# Altium footprint library SOURIAU THD.PcbLib: 34 footprints (part 3 of 5) (continued)
## SOURIAU_EDA-02872-V1-1 [mm] "SOURIAU UTG0187PVDEX Connector VDE 7 Male Contacts Mounted On 20mm M3 Spacer" (continued)
  text "VDE7M" at -3.5,14.8 h1.5
  text "7" at -0.667,-1 h2
  text "6" at -6.768,2.55 h2
  text "5" at -6.815,-4.55 h2
  text "4" at -0.714,-8.1 h2
  text "3" at 5.482,-4.55 h2
  text "2" at 5.482,2.55 h2
  text "1" at -0.238,6.1 h2
  text "7" at -0.667,-1 h2
3D body "SOURIAU_EDA-02872-V1-1.stp": height 35.6, standoff -12.9, extent -16.775,-16.775 16.775,16.775

## SOURIAU_EDA-03025-V1-0 [mm] "SOURIAU UTO0128P21T Adapter Kit For PCB Mount, 8 Poles, Shell Size 12, UT Bantam Circular Male Connector"
height 31.7
pads (12):
  round 1.9 hole 1.2: 1(0,0) 2(4.45,0.9) 3(3.45,-2.85) 4(0,-4.5) 5(-3.45,-2.85) 6(-4.45,0.9) 7(-2,4) 8(2,4)
  round 6.2 hole 3.2: MECH1(-10.31,10.31) MECH2(10.31,10.31) MECH3(-10.31,-10.31) MECH4(10.31,-10.31)
Top Overlay:
  circle w0.2: c0,0 r9.48
  circle w0.2: c2,4 r1.6
  circle w0.2: c2,4 r1.35
  circle w0.2: c-2,4 r1.35
  circle w0.2: c-4.45,0.9 r1.35
  circle w0.2: c0,-4.5 r1.35
  circle w0.2: c3.45,-2.85 r1.35
  circle w0.2: c4.45,0.9 r1.35
  circle w0.2: c-3.45,-2.85 r1.6
  circle w0.2: c-3.45,-2.85 r1.35
  circle w0.2: c0,0 r1.6
  circle w0.2: c0,0 r1.35
  lines w0.2: -13.09,-8.184 -13.09,8.184 ; -8.642,3.898 -9.798,4.566 cw(c0,0) -8.383,6.826 -6.579,6.826 ; -8.184,-13.09 8.184,-13.09 ; -8.184,13.09 8.184,13.09 ; -4.102,-0.404 -3.862,-1.304 ; -3.613,1.959 -2.837,2.941 ; -3.277,-5.758 cw(c0,0) 4.659,4.71 ; -2.622,-9.11 -1.72,-10.672 ccw(c0,0) 0.945,-10.769 0.945,-9.433 ; -2.007,-3.54 -1.218,-3.918 ; -1.726,-6.396 ccw(c0,0) 5.71,3.359 ; -0.65,4 0.4,4 ; 1.218,-3.918 2.232,-3.432 ; 1.568,0.317 3.127,0.632 ; 3.798,-1.546 4.102,-0.404 ; 7.697,5.535 8.853,6.203 cw(c0,0) 10.102,3.847 9.201,2.285 ; 13.09,-8.184 13.09,8.184 ; -8.632,-1.433 ccw(c0,0) -8.192,-3.075 -7.24,-2.82 ccw(c0,0) -5.616,-5.37 -6.249,-6.125 ccw(c0,0) -4.947,-7.218 -4.313,-6.463 ccw(c0,0) 3.734,-6.814 4.299,-7.621 ccw(c0,0) 5.691,-6.646 5.126,-5.839 ccw(c0,0) 7.62,-1.52 8.601,-1.606 ccw(c0,0) 8.75,0.088 7.768,0.174 ccw(c0,0) 1.65,7.593 1.65,8.593 ccw(c0,0) -1.65,8.593 -1.65,7.593 ccw(c0,0) -7.68,-1.178 -8.632,-1.433
  text "8" at 4.25,2.745 h1.2
  text "5" at -2.643,-5.887 h1.2
  text "1" at -2.437,0.898 h1.2
Mechanical 8:
  lines w0.1: -10.81,-10.31 -10.31,-10.31 ; -10.81,10.31 -10.31,10.31 ; -10.31,-10.81 -10.31,-10.31 ; -10.31,-9.81 -10.31,-10.31 ; -10.31,9.81 -10.31,10.31 ; -10.31,10.81 -10.31,10.31 ; -9.81,-10.31 -10.31,-10.31 ; -9.81,10.31 -10.31,10.31 ; -4.95,0.9 -4.45,0.9 ; -4.45,0.4 -4.45,0.9 ; -4.45,1.4 -4.45,0.9 ; -3.95,-2.85 -3.45,-2.85 ; -3.95,0.9 -4.45,0.9 ; -3.45,-3.35 -3.45,-2.85 ; -3.45,-2.35 -3.45,-2.85 ; -2.95,-2.85 -3.45,-2.85 ; -2.5,4 -2,4 ; -2,3.5 -2,4 ; -2,4.5 -2,4 ; -1.5,4 -2,4 ; -0.5,-4.5 0,-4.5 ; -0.354,-0.354 0,0 ; -0.354,0.354 0,0 ; 0,-5 0,-4.5 ; 0,-4 0,-4.5 ; 0.354,-0.354 0,0 ; 0.354,0.354 0,0 ; 0.5,-4.5 0,-4.5 ; 1.5,4 2,4 ; 2,3.5 2,4 ; 2,4.5 2,4 ; 2.5,4 2,4 ; 2.95,-2.85 3.45,-2.85 ; 3.45,-3.35 3.45,-2.85 ; 3.45,-2.35 3.45,-2.85 ; 3.95,-2.85 3.45,-2.85 ; 3.95,0.9 4.45,0.9 ; 4.45,0.4 4.45,0.9 ; 4.45,1.4 4.45,0.9 ; 4.95,0.9 4.45,0.9 ; 9.81,-10.31 10.31,-10.31 ; 9.81,10.31 10.31,10.31 ; 10.31,-10.81 10.31,-10.31 ; 10.31,-9.81 10.31,-10.31 ; 10.31,9.81 10.31,10.31 ; 10.31,10.81 10.31,10.31 ; 10.81,-10.31 10.31,-10.31 ; 10.81,10.31 10.31,10.31
Mechanical 14:
  circle w0.1: c0,0 r9.48
  circle w0.1: c0,0 r6.625
  circle w0.1: c-10.31,-10.31 r1.45
  circle w0.1: c-10.31,-10.31 r2.8
  circle w0.1: c10.31,-10.31 r1.45
  circle w0.1: c10.31,-10.31 r2.8
  circle w0.1: c10.31,10.31 r1.45
  circle w0.1: c10.31,10.31 r2.8
  circle w0.1: c-10.31,10.31 r1.45
  circle w0.1: c-10.31,10.31 r2.8
  circle w0.1: c2,4 r1.6
  circle w0.1: c2,4 r1.35
  circle w0.1: c-2,4 r1.35
  circle w0.1: c-4.45,0.9 r1.35
  circle w0.1: c0,-4.5 r1.35
  circle w0.1: c3.45,-2.85 r1.35
  circle w0.1: c4.45,0.9 r1.35
  circle w0.1: c-3.45,-2.85 r1.6
  circle w0.1: c-3.45,-2.85 r1.35
  circle w0.1: c0,0 r1.6
  circle w0.1: c0,0 r1.35
  lines w0.1: -8.642,3.898 -9.798,4.566 cw(c0,0) -8.383,6.826 -6.579,6.826 ; -4.102,-0.404 -3.862,-1.304 ; -3.613,1.959 -2.837,2.941 ; -2.622,-9.11 -1.72,-10.672 ccw(c0,0) 0.945,-10.769 0.945,-9.433 ; -2.007,-3.54 -1.218,-3.918 ; -0.65,4 0.4,4 ; 1.218,-3.918 2.232,-3.432 ; 1.568,0.317 3.127,0.632 ; 3.798,-1.546 4.102,-0.404 ; 7.697,5.535 8.853,6.203 cw(c0,0) 10.102,3.847 9.201,2.285 ; -13.09,-11.615 -13.09,11.615 -11.615,13.09 11.615,13.09 13.09,11.615 13.09,-11.615 11.615,-13.09 -11.615,-13.09 -13.09,-11.615 ; -11.472,-10.666 ccw(c-11.28,-10.87) -11.2,-11.138 cw(c-11.059,-11.608) -10.582,-11.495 ccw(c-10.31,-11.43) -10.038,-11.495 cw(c-9.561,-11.608) -9.42,-11.138 ccw(c-9.34,-10.87) -9.148,-10.666 cw(c-8.812,-10.31) -9.148,-9.954 ccw(c-9.34,-9.75) -9.42,-9.482 cw(c-9.561,-9.012) -10.038,-9.125 ccw(c-10.31,-9.19) -10.582,-9.125 cw(c-11.059,-9.012) -11.2,-9.482 ccw(c-11.28,-9.75) -11.472,-9.954 cw(c-11.808,-10.31) -11.472,-10.666 ; -11.472,9.954 ccw(c-11.28,9.75) -11.2,9.482 cw(c-11.059,9.012) -10.582,9.125 ccw(c-10.31,9.19) -10.038,9.125 cw(c-9.561,9.012) -9.42,9.482 ccw(c-9.34,9.75) -9.148,9.954 cw(c-8.812,10.31) -9.148,10.666 ccw(c-9.34,10.87) -9.42,11.138 cw(c-9.561,11.608) -10.038,11.495 ccw(c-10.31,11.43) -10.582,11.495 cw(c-11.059,11.608) -11.2,11.138 ccw(c-11.28,10.87) -11.472,10.666 cw(c-11.808,10.31) -11.472,9.954 ; -8.632,-1.433 ccw(c0,0) -8.192,-3.075 -7.24,-2.82 ccw(c0,0) -5.616,-5.37 -6.249,-6.125 ccw(c0,0) -4.947,-7.218 -4.313,-6.463 ccw(c0,0) 3.734,-6.814 4.299,-7.621 ccw(c0,0) 5.691,-6.646 5.126,-5.839 ccw(c0,0) 7.62,-1.52 8.601,-1.606 ccw(c0,0) 8.75,0.088 7.768,0.174 ccw(c0,0) 1.65,7.593 1.65,8.593 ccw(c0,0) -1.65,8.593 -1.65,7.593 ccw(c0,0) -7.68,-1.178 -8.632,-1.433 ; 9.148,-10.666 ccw(c9.34,-10.87) 9.42,-11.138 cw(c9.561,-11.608) 10.038,-11.495 ccw(c10.31,-11.43) 10.582,-11.495 cw(c11.059,-11.608) 11.2,-11.138 ccw(c11.28,-10.87) 11.472,-10.666 cw(c11.808,-10.31) 11.472,-9.954 ccw(c11.28,-9.75) 11.2,-9.482 cw(c11.059,-9.012) 10.582,-9.125 ccw(c10.31,-9.19) 10.038,-9.125 cw(c9.561,-9.012) 9.42,-9.482 ccw(c9.34,-9.75) 9.148,-9.954 cw(c8.812,-10.31) 9.148,-10.666 ; 9.148,9.954 ccw(c9.34,9.75) 9.42,9.482 cw(c9.561,9.012) 10.038,9.125 ccw(c10.31,9.19) 10.582,9.125 cw(c11.059,9.012) 11.2,9.482 ccw(c11.28,9.75) 11.472,9.954 cw(c11.808,10.31) 11.472,10.666 ccw(c11.28,10.87) 11.2,11.138 cw(c11.059,11.608) 10.582,11.495 ccw(c10.31,11.43) 10.038,11.495 cw(c9.561,11.608) 9.42,11.138 ccw(c9.34,10.87) 9.148,10.666 cw(c8.812,10.31) 9.148,9.954
  text "8" at 4.25,2.745 h1.2
  text "7" at -2.4,3.4 h1.2
  text "6" at -4.821,0.3 h1.2
  text "4" at -0.429,-5.1 h1.2
  text "3" at 3.05,-3.45 h1.2
  text "2" at 4.05,0.3 h1.2
  text "5" at -2.643,-5.887 h1.2
  text "1" at -2.437,0.898 h1.2
3D body "SOURIAU_EDA-03025-V1-0.stp": height 32.93, standoff -14.87, extent -13.41,-13.403 13.41,13.404

## SOURIAU_EDA-03026-V1-0 [mm] "SOURIAU UTO0128S21T Adapter Kit For PCB Mount, 8 Poles, Shell Size 12, UT Bantam Circular Female Connector"
height 24.3
pads (12):
  round 1.9 hole 1.2: 1(0,0) 2(-4.45,0.9) 3(-3.45,-2.85) 4(0,-4.5) 5(3.45,-2.85) 6(4.45,0.9) 7(2,4) 8(-2,4)
  round 6.2 hole 3.2: MECH1(-10.31,10.31) MECH2(10.31,10.31) MECH3(-10.31,-10.31) MECH4(10.31,-10.31)
Top Overlay:
  circle w0.2: c0,0 r1.35
  circle w0.2: c0,0 r1.6
  circle w0.2: c-3.45,-2.85 r1.35
  circle w0.2: c4.45,0.9 r1.35
  circle w0.2: c3.45,-2.85 r1.35
  circle w0.2: c0,-4.5 r1.35
  circle w0.2: c-4.45,0.9 r1.35
  circle w0.2: c-2,4 r1.35
  circle w0.2: c2,4 r1.35
  circle w0.2: c0,0 r9.48
  circle w0.2: c-2,4 r1.6
  circle w0.2: c3.45,-2.85 r1.6
  lines w0.2: -13.09,-8.184 -13.09,8.184 ; -8.641,3.898 -9.798,4.566 cw(c0,0) -8.383,6.826 -6.579,6.826 ; -8.184,-13.09 8.184,-13.09 ; -8.184,13.09 8.184,13.09 ; -5.495,3.665 ccw(c0,-0.035) 1.886,-6.386 ; -4.704,4.629 cw(c0,-0.035) 3.275,-5.794 ; -4.102,-0.404 -3.798,-1.546 ; -3.127,0.632 -1.568,0.317 ; -2.622,-9.11 -1.72,-10.672 ccw(c0,0) 0.945,-10.769 0.945,-9.433 ; -2.232,-3.432 -1.218,-3.918 ; -0.4,4 0.65,4 ; 1.218,-3.918 2.007,-3.54 ; 2.837,2.941 3.613,1.959 ; 3.862,-1.304 4.102,-0.404 ; 7.697,5.535 8.853,6.203 cw(c0,0) 10.102,3.847 9.201,2.285 ; 13.09,-8.184 13.09,8.184 ; -8.632,-1.433 ccw(c0,0) -8.192,-3.075 -7.24,-2.82 ccw(c0,0) -5.616,-5.37 -6.249,-6.125 ccw(c0,0) -4.947,-7.218 -4.313,-6.463 ccw(c0,0) 3.734,-6.814 4.299,-7.621 ccw(c0,0) 5.691,-6.646 5.126,-5.839 ccw(c0,0) 7.62,-1.52 8.601,-1.606 ccw(c0,0) 8.75,0.088 7.768,0.174 ccw(c0,0) 1.65,7.593 1.65,8.593 ccw(c0,0) -1.65,8.593 -1.65,7.593 ccw(c0,0) -7.68,-1.178 -8.632,-1.433
  text "1" at -2.599,-1.227 h1.2
  text "5" at 2.021,-5.887 h1.2
  text "8" at -4.859,2.745 h1.2
Mechanical 8:
  lines w0.1: -10.81,-10.31 -10.31,-10.31 ; -10.81,10.31 -10.31,10.31 ; -10.31,-10.81 -10.31,-10.31 ; -10.31,-9.81 -10.31,-10.31 ; -10.31,9.81 -10.31,10.31 ; -10.31,10.81 -10.31,10.31 ; -9.81,-10.31 -10.31,-10.31 ; -9.81,10.31 -10.31,10.31 ; -4.95,0.9 -4.45,0.9 ; -4.45,0.4 -4.45,0.9 ; -4.45,1.4 -4.45,0.9 ; -3.95,-2.85 -3.45,-2.85 ; -3.95,0.9 -4.45,0.9 ; -3.45,-3.35 -3.45,-2.85 ; -3.45,-2.35 -3.45,-2.85 ; -2.95,-2.85 -3.45,-2.85 ; -2.5,4 -2,4 ; -2,3.5 -2,4 ; -2,4.5 -2,4 ; -1.5,4 -2,4 ; -0.5,-4.5 0,-4.5 ; -0.354,-0.354 0,0 ; -0.354,0.354 0,0 ; 0,-5 0,-4.5 ; 0,-4 0,-4.5 ; 0.354,-0.354 0,0 ; 0.354,0.354 0,0 ; 0.5,-4.5 0,-4.5 ; 1.5,4 2,4 ; 2,3.5 2,4 ; 2,4.5 2,4 ; 2.5,4 2,4 ; 2.95,-2.85 3.45,-2.85 ; 3.45,-3.35 3.45,-2.85 ; 3.45,-2.35 3.45,-2.85 ; 3.95,-2.85 3.45,-2.85 ; 3.95,0.9 4.45,0.9 ; 4.45,0.4 4.45,0.9 ; 4.45,1.4 4.45,0.9 ; 4.95,0.9 4.45,0.9 ; 9.81,-10.31 10.31,-10.31 ; 9.81,10.31 10.31,10.31 ; 10.31,-10.81 10.31,-10.31 ; 10.31,-9.81 10.31,-10.31 ; 10.31,9.81 10.31,10.31 ; 10.31,10.81 10.31,10.31 ; 10.81,-10.31 10.31,-10.31 ; 10.81,10.31 10.31,10.31
Mechanical 14:
  circle w0.1: c0,0 r6.625
  circle w0.1: c0,0 r1.35
  circle w0.1: c0,0 r1.6
  circle w0.1: c-3.45,-2.85 r1.35
  circle w0.1: c4.45,0.9 r1.35
  circle w0.1: c3.45,-2.85 r1.35
  circle w0.1: c0,-4.5 r1.35
  circle w0.1: c-4.45,0.9 r1.35
  circle w0.1: c-2,4 r1.35
  circle w0.1: c2,4 r1.35
  circle w0.1: c-10.31,10.31 r2.8
  circle w0.1: c-10.31,10.31 r1.45
  circle w0.1: c10.31,10.31 r2.8
  circle w0.1: c10.31,10.31 r1.45
  circle w0.1: c10.31,-10.31 r2.8
  circle w0.1: c10.31,-10.31 r1.45
  circle w0.1: c-10.31,-10.31 r2.8
  circle w0.1: c-10.31,-10.31 r1.45
  circle w0.1: c0,0 r9.48
  circle w0.1: c-2,4 r1.6
  circle w0.1: c3.45,-2.85 r1.6
  lines w0.1: -8.641,3.898 -9.798,4.566 cw(c0,0) -8.383,6.826 -6.579,6.826 ; -4.102,-0.404 -3.798,-1.546 ; -3.127,0.632 -1.568,0.317 ; -2.622,-9.11 -1.72,-10.672 ccw(c0,0) 0.945,-10.769 0.945,-9.433 ; -2.232,-3.432 -1.218,-3.918 ; -0.4,4 0.65,4 ; 1.218,-3.918 2.007,-3.54 ; 2.837,2.941 3.613,1.959 ; 3.862,-1.304 4.102,-0.404 ; 7.697,5.535 8.853,6.203 cw(c0,0) 10.102,3.847 9.201,2.285 ; -13.09,-11.615 -11.615,-13.09 11.615,-13.09 13.09,-11.615 13.09,11.615 11.615,13.09 -11.615,13.09 -13.09,11.615 -13.09,-11.615 ; -11.472,-10.666 ccw(c-11.808,-10.31) -11.472,-9.954 cw(c-11.28,-9.75) -11.2,-9.482 ccw(c-11.059,-9.012) -10.582,-9.125 cw(c-10.31,-9.19) -10.038,-9.125 ccw(c-9.561,-9.012) -9.42,-9.482 cw(c-9.34,-9.75) -9.148,-9.954 ccw(c-8.812,-10.31) -9.148,-10.666 cw(c-9.34,-10.87) -9.42,-11.138 ccw(c-9.561,-11.608) -10.038,-11.495 cw(c-10.31,-11.43) -10.582,-11.495 ccw(c-11.059,-11.608) -11.2,-11.138 cw(c-11.28,-10.87) -11.472,-10.666 ; -11.472,9.954 ccw(c-11.808,10.31) -11.472,10.666 cw(c-11.28,10.87) -11.2,11.138 ccw(c-11.059,11.608) -10.582,11.495 cw(c-10.31,11.43) -10.038,11.495 ccw(c-9.561,11.608) -9.42,11.138 cw(c-9.34,10.87) -9.148,10.666 ccw(c-8.812,10.31) -9.148,9.954 cw(c-9.34,9.75) -9.42,9.482 ccw(c-9.561,9.012) -10.038,9.125 cw(c-10.31,9.19) -10.582,9.125 ccw(c-11.059,9.012) -11.2,9.482 cw(c-11.28,9.75) -11.472,9.954 ; -8.632,-1.433 ccw(c0,0) -8.192,-3.075 -7.24,-2.82 ccw(c0,0) -5.616,-5.37 -6.249,-6.125 ccw(c0,0) -4.947,-7.218 -4.313,-6.463 ccw(c0,0) 3.734,-6.814 4.299,-7.621 ccw(c0,0) 5.691,-6.646 5.126,-5.839 ccw(c0,0) 7.62,-1.52 8.601,-1.606 ccw(c0,0) 8.75,0.088 7.768,0.174 ccw(c0,0) 1.65,7.593 1.65,8.593 ccw(c0,0) -1.65,8.593 -1.65,7.593 ccw(c0,0) -7.68,-1.178 -8.632,-1.433 ; 9.148,-10.666 ccw(c8.812,-10.31) 9.148,-9.954 cw(c9.34,-9.75) 9.42,-9.482 ccw(c9.561,-9.012) 10.038,-9.125 cw(c10.31,-9.19) 10.582,-9.125 ccw(c11.059,-9.012) 11.2,-9.482 cw(c11.28,-9.75) 11.472,-9.954 ccw(c11.808,-10.31) 11.472,-10.666 cw(c11.28,-10.87) 11.2,-11.138 ccw(c11.059,-11.608) 10.582,-11.495 cw(c10.31,-11.43) 10.038,-11.495 ccw(c9.561,-11.608) 9.42,-11.138 cw(c9.34,-10.87) 9.148,-10.666 ; 9.148,9.954 ccw(c8.812,10.31) 9.148,10.666 cw(c9.34,10.87) 9.42,11.138 ccw(c9.561,11.608) 10.038,11.495 cw(c10.31,11.43) 10.582,11.495 ccw(c11.059,11.608) 11.2,11.138 cw(c11.28,10.87) 11.472,10.666 ccw(c11.808,10.31) 11.472,9.954 cw(c11.28,9.75) 11.2,9.482 ccw(c11.059,9.012) 10.582,9.125 cw(c10.31,9.19) 10.038,9.125 ccw(c9.561,9.012) 9.42,9.482 cw(c9.34,9.75) 9.148,9.954
  text "1" at -2.599,-1.227 h1.2
  text "5" at 2.021,-5.887 h1.2
  text "6" at 4.079,0.3 h1.2
  text "4" at -0.429,-5.1 h1.2
  text "2" at -4.85,0.3 h1.2
  text "8" at -4.859,2.745 h1.2
  text "7" at 1.6,3.4 h1.2
  text "3" at -3.85,-3.45 h1.2
3D body "SOURIAU_EDA-03026-V1-0.stp": height 32.93, standoff -5.89, extent -13.41,-13.403 13.41,13.404

## SOURIAU_EDA-03146-V1-0 [mm] "SOURIAU UTO01619S21T Adapter Kit For PCB Mount, 19 Poles, Shell Size 16, UT Bantam Circular Female Connector"
height 24.3
pads (23):
  round 1.9 hole 1.2: 1(0,0) 2(-2.756,2.814) 3(-3.806,-0.986) 4(-1.006,-3.786) 5(2.744,-2.786) 6(3.794,1.014) 7(0.994,3.814) 8(-0.006,7.514) 9(-3.756,6.514) 10(-6.506,3.764) 11(-7.506,0.014) 12(-6.506,-3.736) 13(-3.756,-6.486) 14(-0.006,-7.486) 15(3.744,-6.486) 16(6.494,-3.736) 17(7.494,0.014) 18(6.494,3.764) 19(3.744,6.514)
  round 6.2 hole 3.2: MECH1(-12.311,12.319) MECH2(12.299,12.319) MECH3(-12.311,-12.291) MECH4(12.299,-12.291)
Top Overlay:
  circle w0.2: c6.494,3.764 r1.35
  circle w0.2: c3.794,1.014 r1.35
  circle w0.2: c7.494,0.014 r1.35
  circle w0.2: c6.494,-3.736 r1.35
  circle w0.2: c2.744,-2.786 r1.35
  circle w0.2: c3.744,-6.486 r1.35
  circle w0.2: c-0.006,-7.486 r1.35
  circle w0.2: c-1.006,-3.786 r1.35
  circle w0.2: c-3.756,-6.486 r1.35
  circle w0.2: c-6.506,-3.736 r1.35
  circle w0.2: c-3.806,-0.986 r1.35
  circle w0.2: c-7.506,0.014 r1.35
  circle w0.2: c-6.506,3.764 r1.35
  circle w0.2: c-2.756,2.814 r1.35
  circle w0.2: c-3.756,6.514 r1.35
  circle w0.2: c-0.006,7.514 r1.35
  circle w0.2: c0.994,3.814 r1.35
  circle w0.2: c-0.006,0.014 r1.35
  circle w0.2: c-0.006,0.014 r12.66
  circle w0.2: c3.744,-6.486 r1.65
  circle w0.2: c2.744,-2.786 r1.65
  circle w0.2: c-0.006,0.014 r1.65
  circle w0.2: c3.744,6.514 r1.65
  circle w0.2: c-6.506,3.764 r1.65
  lines w0.2: -15.506,-11.083 -15.506,11.11 ; -11.411,5.508 -12.549,6.164 cw(c-0.006,0.014) -10.736,8.959 -8.964,8.959 ; -11.102,-15.486 11.091,-15.486 ; -11.102,15.514 11.091,15.514 ; -7.961,5.651 ccw(c-0.006,0.014) 5.877,-7.761 ; -7.16,-1.291 -6.855,-2.432 ; -7.16,1.319 -6.932,2.17 ; -6.036,7.675 cw(c-0.006,0.014) 6.184,7.547 ; -5.551,-4.691 -4.71,-5.532 ; -5.339,4.93 -4.71,5.559 ; -3.446,0.315 -3.115,1.512 ; -3.273,-12.217 -2.387,-13.752 ccw(c-0.006,0.014) 0.939,-13.924 0.939,-12.611 ; -2.851,-1.941 -1.96,-2.832 ; -2.452,-6.835 -1.311,-7.141 ; -2.451,6.862 -1.31,7.166 ; -1.81,1.851 -1.162,1.191 ; 0.299,-3.438 1.15,-3.211 ; 0.347,6.21 0.642,5.117 ; 1.299,-7.141 2.151,-6.913 ; 1.949,2.859 2.84,1.968 ; 3.184,-1.196 3.435,-0.288 ; 4.911,-5.32 5.54,-4.691 ; 4.911,5.347 5.54,4.718 ; 6.844,-2.432 7.149,-1.291 ; 6.844,2.46 7.149,1.319 ; 8.007,-5.541 ccw(c-0.006,0.014) 8.21,5.264 ; 10.455,7.144 11.593,7.801 cw(c-0.006,0.014) 13.107,4.834 12.221,3.299 ; 15.494,-11.083 15.494,11.11 ; -11.447,-2.431 ccw(c-0.006,0.014) -11.137,-3.59 -10.121,-3.318 ccw(c-0.006,0.014) -7.3,-7.746 -7.976,-8.552 ccw(c-0.006,0.014) -7.057,-9.323 -6.381,-8.517 ccw(c-0.006,0.014) 5.602,-9.041 6.205,-9.902 ccw(c-0.006,0.014) 7.188,-9.214 6.585,-8.352 ccw(c-0.006,0.014) 10.535,-1.511 11.582,-1.602 ccw(c-0.006,0.014) 11.687,-0.407 10.639,-0.315 ccw(c-0.006,0.014) 1.394,10.571 1.394,11.63 ccw(c-0.006,0.014) -1.406,11.63 -1.406,10.571 ccw(c-0.006,0.014) -10.432,-2.159 -11.447,-2.431
  text "1" at -0.936,2.014 h1.1
  text "10" at -7.284,5.874 h1.1
  text "15" at 5.882,-6.875 h1.1
  text "5" at 4.644,-1.829 h1.1
  text "19" at 6.022,5.636 h1.1
Mechanical 8:
  lines w0.2: -12.811,-12.291 -12.311,-12.291 ; -12.811,12.319 -12.311,12.319 ; -12.311,-12.791 -12.311,-12.291 ; -12.311,-11.791 -12.311,-12.291 ; -12.311,11.819 -12.311,12.319 ; -12.311,12.819 -12.311,12.319 ; -11.811,-12.291 -12.311,-12.291 ; -11.811,12.319 -12.311,12.319 ; -8.006,0.014 -7.506,0.014 ; -7.506,-0.486 -7.506,0.014 ; -7.506,0.514 -7.506,0.014 ; -7.006,-3.736 -6.506,-3.736 ; -7.006,0.014 -7.506,0.014 ; -7.006,3.764 -6.506,3.764 ; -6.506,-4.236 -6.506,-3.736 ; -6.506,-3.236 -6.506,-3.736 ; -6.506,3.264 -6.506,3.764 ; -6.506,4.264 -6.506,3.764 ; -6.006,-3.736 -6.506,-3.736 ; -6.006,3.764 -6.506,3.764 ; -4.306,-0.986 -3.806,-0.986 ; -4.256,-6.486 -3.756,-6.486 ; -4.256,6.514 -3.756,6.514 ; -3.806,-1.486 -3.806,-0.986 ; -3.806,-0.486 -3.806,-0.986 ; -3.756,-6.986 -3.756,-6.486 ; -3.756,-5.986 -3.756,-6.486 ; -3.756,6.014 -3.756,6.514 ; -3.756,7.014 -3.756,6.514 ; -3.306,-0.986 -3.806,-0.986 ; -3.256,-6.486 -3.756,-6.486 ; -3.256,2.814 -2.756,2.814 ; -3.256,6.514 -3.756,6.514 ; -2.756,2.314 -2.756,2.814 ; -2.756,3.314 -2.756,2.814 ; -2.256,2.814 -2.756,2.814 ; -1.506,-3.786 -1.006,-3.786 ; -1.006,-4.286 -1.006,-3.786 ; -1.006,-3.286 -1.006,-3.786 ; -0.506,-7.486 -0.006,-7.486 ; -0.506,-3.786 -1.006,-3.786 ; -0.506,7.514 -0.006,7.514 ; -0.354,-0.354 0,0 ; -0.354,0.354 0,0 ; -0.006,-7.986 -0.006,-7.486 ; -0.006,-6.986 -0.006,-7.486 ; -0.006,7.014 -0.006,7.514 ; -0.006,8.014 -0.006,7.514 ; 0.354,-0.354 0,0 ; 0.354,0.354 0,0 ; 0.494,-7.486 -0.006,-7.486 ; 0.494,3.814 0.994,3.814 ; 0.494,7.514 -0.006,7.514 ; 0.994,3.314 0.994,3.814 ; 0.994,4.314 0.994,3.814 ; 1.494,3.814 0.994,3.814 ; 2.244,-2.786 2.744,-2.786 ; 2.744,-3.286 2.744,-2.786 ; 2.744,-2.286 2.744,-2.786 ; 3.244,-6.486 3.744,-6.486 ; 3.244,-2.786 2.744,-2.786 ; 3.244,6.514 3.744,6.514 ; 3.294,1.014 3.794,1.014 ; 3.744,-6.986 3.744,-6.486 ; 3.744,-5.986 3.744,-6.486 ; 3.744,6.014 3.744,6.514 ; 3.744,7.014 3.744,6.514 ; 3.794,0.514 3.794,1.014 ; 3.794,1.514 3.794,1.014 ; 4.244,-6.486 3.744,-6.486 ; 4.244,6.514 3.744,6.514 ; 4.294,1.014 3.794,1.014 ; 5.994,-3.736 6.494,-3.736 ; 5.994,3.764 6.494,3.764 ; 6.494,-4.236 6.494,-3.736 ; 6.494,-3.236 6.494,-3.736 ; 6.494,3.264 6.494,3.764 ; 6.494,4.264 6.494,3.764 ; 6.994,-3.736 6.494,-3.736 ; 6.994,0.014 7.494,0.014 ; 6.994,3.764 6.494,3.764 ; 7.494,-0.486 7.494,0.014 ; 7.494,0.514 7.494,0.014 ; 7.994,0.014 7.494,0.014 ; 11.799,-12.291 12.299,-12.291 ; 11.799,12.319 12.299,12.319 ; 12.299,-12.791 12.299,-12.291 ; 12.299,-11.791 12.299,-12.291 ; 12.299,11.819 12.299,12.319 ; 12.299,12.819 12.299,12.319 ; 12.799,-12.291 12.299,-12.291 ; 12.799,12.319 12.299,12.319
Mechanical 14:
  circle w0.2: c-0.006,0.014 r12.66
  circle w0.2: c-12.311,-12.291 r1.45
  circle w0.2: c-12.311,-12.291 r2.8
  circle w0.2: c12.299,-12.291 r1.45
  circle w0.2: c12.299,-12.291 r2.8
  circle w0.2: c12.299,12.319 r1.45
  circle w0.2: c12.299,12.319 r2.8
  circle w0.2: c-12.311,12.319 r1.45
  circle w0.2: c-12.311,12.319 r2.8
  circle w0.2: c3.744,-6.486 r1.65
  circle w0.2: c2.744,-2.786 r1.65
  circle w0.2: c-0.006,0.014 r1.65
  circle w0.2: c3.744,6.514 r1.65
  circle w0.2: c-6.506,3.764 r1.65
  circle w0.2: c3.744,6.514 r1.35
  circle w0.2: c6.494,3.764 r1.35
  circle w0.2: c3.794,1.014 r1.35
  circle w0.2: c7.494,0.014 r1.35
  circle w0.2: c6.494,-3.736 r1.35
  circle w0.2: c2.744,-2.786 r1.35
  circle w0.2: c3.744,-6.486 r1.35
  circle w0.2: c-0.006,-7.486 r1.35
  circle w0.2: c-1.006,-3.786 r1.35
  circle w0.2: c-3.756,-6.486 r1.35
  circle w0.2: c-6.506,-3.736 r1.35
  circle w0.2: c-3.806,-0.986 r1.35
  circle w0.2: c-7.506,0.014 r1.35
  circle w0.2: c-6.506,3.764 r1.35
  circle w0.2: c-2.756,2.814 r1.35
  circle w0.2: c-3.756,6.514 r1.35
  circle w0.2: c-0.006,7.514 r1.35
  circle w0.2: c0.994,3.814 r1.35
  circle w0.2: c-0.006,0.014 r1.35
  lines w0.2: -11.411,5.508 -12.549,6.164 cw(c-0.006,0.014) -10.736,8.959 -8.964,8.959 ; -7.961,5.651 ccw(c-0.006,0.014) 5.877,-7.761 ; -7.16,-1.291 -6.855,-2.432 ; -7.16,1.319 -6.932,2.17 ; -6.036,7.675 cw(c-0.006,0.014) 6.184,7.547 ; -5.551,-4.691 -4.71,-5.532 ; -5.339,4.93 -4.71,5.559 ; -3.446,0.315 -3.115,1.512 ; -3.273,-12.217 -2.387,-13.752 ccw(c-0.006,0.014) 0.939,-13.924 0.939,-12.611 ; -2.851,-1.941 -1.96,-2.832 ; -2.452,-6.835 -1.311,-7.141 ; -2.451,6.862 -1.31,7.166 ; -1.81,1.851 -1.162,1.191 ; 0.299,-3.438 1.15,-3.211 ; 0.347,6.21 0.642,5.117 ; 1.299,-7.141 2.151,-6.913 ; 1.949,2.859 2.84,1.968 ; 3.184,-1.196 3.435,-0.288 ; 4.911,-5.32 5.54,-4.691 ; 4.911,5.347 5.54,4.718 ; 6.844,-2.432 7.149,-1.291 ; 6.844,2.46 7.149,1.319 ; 8.007,-5.541 ccw(c-0.006,0.014) 8.21,5.264 ; 10.455,7.144 11.593,7.801 cw(c-0.006,0.014) 13.107,4.834 12.221,3.299 ; -15.506,-13.464 -15.506,13.491 -13.483,15.514 13.472,15.514 15.494,13.491 15.494,-13.464 13.472,-15.486 -13.483,-15.486 -15.506,-13.464 ; -13.473,-12.648 ccw(c-13.281,-12.851) -13.2,-13.12 cw(c-13.06,-13.589) -12.583,-13.476 ccw(c-12.311,-13.411) -12.038,-13.476 cw(c-11.561,-13.589) -11.421,-13.12 ccw(c-11.341,-12.851) -11.149,-12.648 cw(c-10.812,-12.291) -11.149,-11.935 ccw(c-11.341,-11.731) -11.421,-11.463 cw(c-11.561,-10.994) -12.038,-11.107 ccw(c-12.311,-11.171) -12.583,-11.107 cw(c-13.06,-10.994) -13.2,-11.463 ccw(c-13.281,-11.731) -13.473,-11.935 cw(c-13.809,-12.291) -13.473,-12.648 ; -13.473,11.962 ccw(c-13.281,11.759) -13.2,11.49 cw(c-13.06,11.021) -12.583,11.134 ccw(c-12.311,11.199) -12.038,11.134 cw(c-11.561,11.021) -11.421,11.49 ccw(c-11.341,11.759) -11.149,11.962 cw(c-10.812,12.319) -11.149,12.675 ccw(c-11.341,12.879) -11.421,13.147 cw(c-11.561,13.616) -12.038,13.503 ccw(c-12.311,13.439) -12.583,13.503 cw(c-13.06,13.616) -13.2,13.147 ccw(c-13.281,12.879) -13.473,12.675 cw(c-13.809,12.319) -13.473,11.962 ; -11.447,-2.431 ccw(c-0.006,0.014) -11.137,-3.59 -10.121,-3.318 ccw(c-0.006,0.014) -7.3,-7.746 -7.976,-8.552 ccw(c-0.006,0.014) -7.057,-9.323 -6.381,-8.517 ccw(c-0.006,0.014) 5.602,-9.041 6.205,-9.902 ccw(c-0.006,0.014) 7.188,-9.214 6.585,-8.352 ccw(c-0.006,0.014) 10.535,-1.511 11.582,-1.602 ccw(c-0.006,0.014) 11.687,-0.407 10.639,-0.315 ccw(c-0.006,0.014) 1.394,10.571 1.394,11.63 ccw(c-0.006,0.014) -1.406,11.63 -1.406,10.571 ccw(c-0.006,0.014) -10.432,-2.159 -11.447,-2.431 ; 11.137,-12.648 ccw(c11.329,-12.851) 11.41,-13.12 cw(c11.55,-13.589) 12.027,-13.476 ccw(c12.299,-13.411) 12.572,-13.476 cw(c13.049,-13.589) 13.189,-13.12 ccw(c13.269,-12.851) 13.461,-12.648 cw(c13.798,-12.291) 13.461,-11.935 ccw(c13.269,-11.731) 13.189,-11.463 cw(c13.049,-10.994) 12.572,-11.107 ccw(c12.299,-11.171) 12.027,-11.107 cw(c11.55,-10.994) 11.41,-11.463 ccw(c11.329,-11.731) 11.137,-11.935 cw(c10.801,-12.291) 11.137,-12.648 ; 11.137,11.962 ccw(c11.329,11.759) 11.41,11.49 cw(c11.55,11.021) 12.027,11.134 ccw(c12.299,11.199) 12.572,11.134 cw(c13.049,11.021) 13.189,11.49 ccw(c13.269,11.759) 13.461,11.962 cw(c13.798,12.319) 13.461,12.675 ccw(c13.269,12.879) 13.189,13.147 cw(c13.049,13.616) 12.572,13.503 ccw(c12.299,13.439) 12.027,13.503 cw(c11.55,13.616) 11.41,13.147 ccw(c11.329,12.879) 11.137,12.675 cw(c10.801,12.319) 11.137,11.962
  text "1" at -1.006,1.964 h1.2
  text "10" at -7.353,5.874 h1.2
  text "15" at 5.832,-6.975 h1.2
  text "5" at 4.619,-1.886 h1.2
  text "19" at 5.953,5.586 h1.2
  text "18" at 5.809,3.164 h1.2
  text "17" at 6.809,-0.586 h1.2
  text "16" at 5.831,-4.336 h1.2
  text "14" at -0.714,-8.086 h1.2
  text "13" at -4.441,-7.086 h1.2
  text "12" at -7.191,-4.336 h1.2
  text "11" at -7.986,-0.586 h1.2
  text "9" at -4.127,5.914 h1.2
  text "8" at -0.406,6.914 h1.2
  text "7" at 0.594,3.214 h1.2
  text "6" at 3.423,0.414 h1.2
  text "4" at -1.434,-4.386 h1.2
  text "3" at -4.206,-1.586 h1.2
  text "2" at -3.156,2.214 h1.2
3D body "SOURIAU_EDA-03146-V1-0.stp": height 32.93, standoff -5.89, extent -15.506,-15.486 15.494,15.514